# Altium integrated library Integrated_Library.IntLib: 173 symbols (part 1 of 2) (continued)
## R1SE-0505/H2-R
designator U?
footprint R1SE-0505-SO8 (SO, 8-Leads, Body 12.75x10.70mm, Pitch 2.54mm, IPC Medium Density)
pins: 1 -VIN, 2 +VIN, 4 -VOUT, 5 +VUOT, 8 NC

## RCV_PADD
designator RCV?, comment RCV_PAD
pins: 1 A0, 2 A1, 3 A2, 4 A3, 5 A4, 6 A5, 7 A6, 8 A7, 9 B0, 10 B1, 11 B2, 12 B3, 13 B4, 14 B5, 15 B6, 16 B7

## RCVPad
designator *
pins: 1 A0, 2 A1, 3 A2, 4 A3, 5 A4, 6 A5, 7 A6, 8 A7, 9 GND

## rectifier
designator *

## RESISTOR VAR_0
designator R?
OriginalSymbolOrigin: (0,0)
pins: 1 A, 2 WIPER, 3 B

## SMW250-02
designator J?
OriginalSymbolOrigin: (0,0)
footprint SMW250-02P
pins: 1, 2

## SN65HVD230_1
designator U?
pins: 1 D, 2 GND, 3 VCC (power), 4 R, 5 VREF, 6 CANL, 7 CANH, 8 RS (power)

## SN65HVD1040
designator *
pins: 1 TXD, 2 GND, 3 VCC (power), 4 RXD, 5 SPLIT, 6 CANL, 7 CANH, 8 STB (power)

## STWD100
designator U?
pins: 1 ~{WDO}, 2 GND, 3 ~{EN}, 4 WDI, 5 VCC

## TC1014
designator U?
Manufacturer: MICROCHIP; Part Number: TC1014-3.3VCT713
footprint SOT95P245X110-5N (SOT23, 5-Leads, Body 2.90x2.45mm, Pitch 0.95mm, IPC Medium Density)
pins: 1 +VIN, 2 GND, 3 /SHDN, 4 Bypass, 5 +VOUT

## test
designator *
pins: 6

## TestPoint
designator TP?
pins: 1 TP

## THS4211
designator U?
pins: 1 NC, 2 IN-, 3 IN+, 4 VS-, 5 NC, 6 Vout, 7 Vs+, 8 NC

## TL431
designator D?
Shunt regulator
footprint SOT95P245X110-3N (SOT23, 3-Leads, Body 2.90x2.45mm, Pitch 0.95mm, IPC Medium Density)
pins: 1 Cathode, 2 Ref, 3 Anode

## TLP181
designator U?
OriginalSymbolOrigin: (0,0)
pins: 1 ANODE, 3 CATHODE, 4 EMITTER, 6 COLLECTOR

## TLP241
designator U?
pins: 1 ANODE, 2 CATHODE, 3 Drain, 4 Drain

## TPS73512
designator U?, comment TPS53312
pins: 1 OUT, 2 NC, 3 NR/FB, 4 GND, 5 EN, 6 NC, 7 NC, 8 IN, 9 Thermal PAD

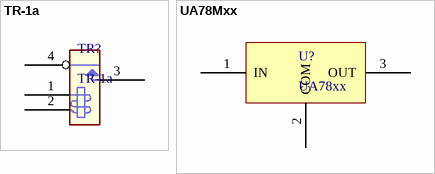
[diagram p5: symbols TR-1a to UA78Mxx]

## TR-1a
designator TR?
footprint TR1A
pins: 1 COIL1, 2 COIL2, 3 NO, 4 COMMON

## UA78Mxx
designator U?, comment UA78xx
footprint SOT230P700X180-4N (SOT223, 4-Leads, Body 6.50x7.00mm (avg), Pitch 2.30mm, IPC Medium Density)
pins: 1 IN, 2 COM, 3 OUT


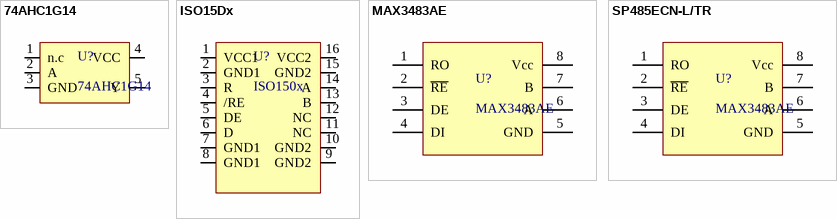
[diagram p6: symbols 74AHC1G14 to SP485ECN-L/TR]

## 74AHC1G14
designator U?
Manufacturer: nexperia; Part Number: 74AHC1G14
footprint SOT95P245X110-5N (SOT23, 5-Leads, Body 2.90x2.45mm, Pitch 0.95mm, IPC Medium Density)
pins: 1 n.c, 2 A, 3 GND, 4 VCC, 5 Y

## ISO15Dx
designator U?, comment ISO150x
ISOx5 Isolated 3.3-V Half- and Full-Duplex RS-485 Transceivers; Part Number: 74AHC1G14; Manufacturer: nexperia
footprint SOIC127P1030X265-16N (SOIC, 16-Leads, Body 10.30x7.50mm, Pitch 1.27mm, IPC Medium Density)
pins: 1 VCC1, 2 GND1, 3 R, 4 /RE, 5 DE, 6 D, 7 GND1, 8 GND1, 9 GND2, 10 GND2, 11 NC, 12 NC, 13 B, 14 A, 15 GND2, 16 VCC2

## MAX3483AE
designator U?
pins: 1 RO, 2 ~{RE}, 3 DE, 4 DI, 5 GND, 6 A, 7 B, 8 Vcc

## SP485ECN-L/TR
designator U?, comment MAX3483AE
Part Number: SP481ECN-L/TR; Manufacturer: MaxLinear
footprint SOIC127P600X175-8N (SOIC, 8-Leads, Body 4.90x3.90mm, Pitch 1.27mm, IPC Medium Density)
pins: 1 RO, 2 ~{RE}, 3 DE, 4 DI, 5 GND, 6 A, 7 B, 8 Vcc


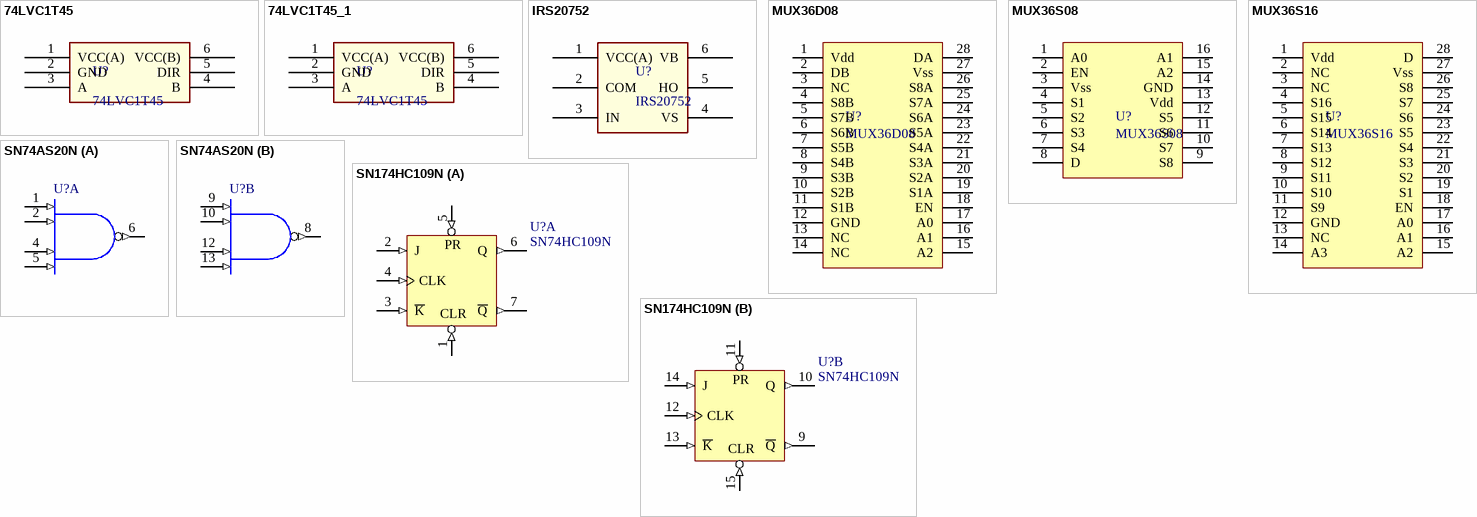
[diagram p7: symbols 74LVC1T45 to SN174HC109N]

## 74LVC1T45
designator U?
pins: 1 VCC(A), 2 GND, 3 A, 4 B, 5 DIR, 6 VCC(B)

## 74LVC1T45_1
designator U?, comment 74LVC1T45
footprint SOT95P285X130-6N (SOT23, 6-Leads, Body 3.00x2.85mm, Pitch 0.95mm, IPC Medium Density)
pins: 1 VCC(A), 2 GND, 3 A (power), 4 B, 5 DIR, 6 VCC(B)

## IRS20752
designator U?
Manufacturer: Infineon; ModelNumber: *
footprint SOT95P280X145-6N (SOT23, 6-Leads, Body 2.90x2.80mm, Pitch 0.95mm, IPC Medium Density)
pins: 1 VCC(A), 2 COM, 3 IN, 4 VS, 5 HO, 6 VB

## MUX36D08
designator U?
pins: 1 Vdd, 2 DB, 3 NC, 4 S8B, 5 S7B, 6 S6B, 7 S5B, 8 S4B, 9 S3B, 10 S2B, 11 S1B, 12 GND, 13 NC, 14 NC, 15 A2, 16 A1, 17 A0, 18 EN, 19 S1A, 20 S2A, 21 S3A, 22 S4A, 23 S5A, 24 S6A, 25 S7A, 26 S8A, 27 Vss, 28 DA

## MUX36S08
designator U?
pins: 1 A0, 2 EN, 3 Vss, 4 S1, 5 S2, 6 S3, 7 S4, 8 D, 9 S8, 10 S7, 11 S6, 12 S5, 13 Vdd, 14 GND, 15 A2, 16 A1

## MUX36S16
designator U?
pins: 1 Vdd, 2 NC, 3 NC, 4 S16, 5 S15, 6 S14, 7 S13, 8 S12, 9 S11, 10 S10, 11 S9, 12 GND, 13 NC, 14 A3, 15 A2, 16 A1, 17 A0, 18 EN, 19 S1, 20 S2, 21 S3, 22 S4, 23 S5, 24 S6, 25 S7, 26 S8, 27 Vss, 28 D

## SN74AS20N
designator U?
Dual 4-Input Positive-NAND Gate; Note: Pins 3 and 11 are not connected and not drawn; Published: 8-Jun-2000; LatestRevisionDate: 04-Mar-2005; LatestRevisionNote: Stylized 3D Model Added.; DatasheetVersion: Dec-1994; PackageVersion: Oct-1995; PackageReference: N014; Publisher: Altium Limited; PackageDescription: DIP; 14 Leads; Row Spacing 7.62 mm; Pitch 2.54 mm; ComponentLink1Description: Manufacturer Link; ComponentLink1URL: http://www.ti.com/; ComponentLink2Description: Datasheet; ComponentLink2URL: http://www-s.ti.com/sc/ds/sn74als20a.pdf
footprint N014 (DIP; 14 Leads; Row Spacing 7.62 mm; Pitch 2.54 mm)
3D model N014 (DIP; 14 Leads; Row Spacing 7.62 mm; Pitch 2.54 mm)
signal-integrity model SN74AS20N
pins on every part: 7 GND (power) hidden to GND, 14 VCC (power) hidden to VCC
part A pins: 1 A (in), 2 B (in), 4 C (in), 5 D (in), 6 Y (out)
part B pins: 8 Y (out), 9 A (in), 10 B (in), 12 C (in), 13 D (in)

## SN174HC109N
designator U?, comment SN74HC109N
Dual J-K Positive-Edge-Triggered Flip-Flop with Clear and Preset; Published: 8-Jun-2000; LatestRevisionDate: 04-Mar-2005; LatestRevisionNote: Stylized 3D Model Added.; DatasheetVersion: Jun-1989; PackageVersion: Oct-1995; PackageReference: N016; Publisher: Altium Limited; PackageDescription: DIP; 16 Leads; Row Spacing 7.62 mm; Pitch 2.54 mm; Code_JEDEC: MS-001-BB; ComponentLink1Description: Manufacturer Link; ComponentLink1URL: http://www.ti.com/; ComponentLink2Description: Datasheet; ComponentLink2URL: http://www-s.ti.com/sc/ds/sn74hc109.pdf
footprint N016 (DIP; 16 Leads; Row Spacing 7.62 mm; Pitch 2.54 mm)
3D model N016 (DIP; 16 Leads; Row Spacing 7.62 mm; Pitch 2.54 mm)
signal-integrity model SN74HC109N
pins on every part: 8 GND (power) hidden to GND, 16 VCC (power) hidden to VCC
part A pins: 1 CLR (in), 2 J (in), 3 ~{K} (in), 4 CLK (in), 5 PR (in), 6 Q (out), 7 ~{Q} (out)
part B pins: 9 ~{Q} (out), 10 Q (out), 11 PR (in), 12 CLK (in), 13 ~{K} (in), 14 J (in), 15 CLR (in)


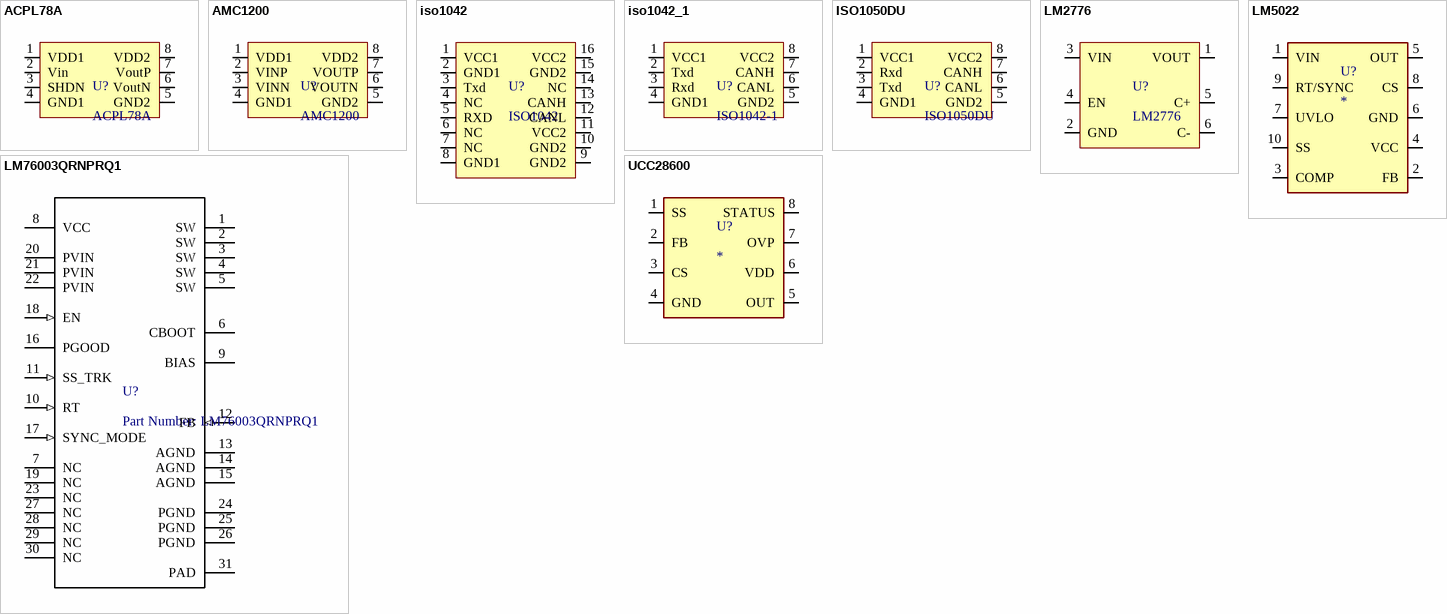
[diagram p8: symbols ACPL78A to UCC28600]

## ACPL78A
designator U?
footprint SOIC127P1150X318-8N-ACPL87A (SOIC, 8-Leads, Body 5.85x6.85mm, Pitch 1.27mm, IPC Medium Density)
pins: 1 VDD1, 2 Vin, 3 SHDN, 4 GND1, 5 GND2, 6 VoutN, 7 VoutP, 8 VDD2

## AMC1200
designator U?
footprint SOIC127P1110X280-8N-AMC (SOIC, 8-Leads, Body 5.85x7.50mm, Pitch 1.27mm, IPC Medium Density)
pins: 1 VDD1, 2 VINP, 3 VINN, 4 GND1, 5 GND2, 6 VOUTN, 7 VOUTP, 8 VDD2

## iso1042
designator U?, comment ISO1042
pins: 1 VCC1, 2 GND1, 3 Txd, 4 NC, 5 RXD, 6 NC, 7 NC, 8 GND1, 9 GND2, 10 GND2, 11 VCC2, 12 CANL, 13 CANH, 14 NC, 15 GND2, 16 VCC2

## iso1042_1
designator U?, comment ISO1042-1
footprint PG-DSO-8 (SOP, 8-Leads, Body 5,0x4,0mm (max), Pitch 1,27mm, IPC Medium Density)
pins: 1 VCC1, 2 Txd, 3 Rxd, 4 GND1, 5 GND2, 6 CANL, 7 CANH, 8 VCC2

## ISO1050DU
designator U?
ISO1050 Isolated CAN Transceiver
footprint PG-DSO-8 (SOP, 8-Leads, Body 5,0x4,0mm (max), Pitch 1,27mm, IPC Medium Density)
pins: 1 VCC1, 2 Rxd, 3 Txd, 4 GND1, 5 GND2, 6 CANL, 7 CANH, 8 VCC2

## LM2776
designator U?
Manufacturer: Texas Instruments; Part Number: LM2776
footprint SOT95P280X145-6N (SOT23, 6-Leads, Body 2.90x2.80mm, Pitch 0.95mm, IPC Medium Density)
pins: 1 VOUT, 2 GND, 3 VIN, 4 EN, 5 C+, 6 C-

## LM5022
designator U?
footprint TSSOP50P490X110-10N (TSSOP, 10-Leads, Body 3.00x3.00mm, Pitch 0.50mm, IPC Medium Density)
pins: 1 VIN, 2 FB, 3 COMP, 4 VCC, 5 OUT, 6 GND, 7 UVLO, 8 CS, 9 RT/SYNC, 10 SS

## LM76003QRNPRQ1
designator U?, comment Part Number: LM76003QRNPRQ1
No Description Available; Vendor: Texas Instruments; Built_By: Texas_Instrument_Team; Manufacturer_Part_Number: LM76003QRNPRQ1; Copyright: Copyright (C) 2018 Accelerated Designs. All rights reserved; RefDes: RefDes; Type: DEV; Value: Value
pins: 1 SW (power), 2 SW (power), 3 SW (power), 4 SW (power), 5 SW (power), 6 CBOOT (power), 7 NC, 8 VCC (power), 9 BIAS, 10 RT (in), 11 SS_TRK (in), 12 FB (in), 13 AGND (power), 14 AGND (power), 15 AGND (power), 16 PGOOD (oc), 17 SYNC_MODE (in), 18 EN (in), 19 NC, 20 PVIN (power), 21 PVIN (power), 22 PVIN (power), 23 NC, 24 PGND (power), 25 PGND (power), 26 PGND (power), 27 NC, 28 NC, 29 NC, 30 NC, 31 PAD (power)

## UCC28600
designator U?
footprint SOIC127P600X175-8N (SOIC, 8-Leads, Body 4.90x3.90mm, Pitch 1.27mm, IPC Medium Density)
pins: 1 SS, 2 FB, 3 CS, 4 GND, 5 OUT, 6 VDD, 7 OVP, 8 STATUS


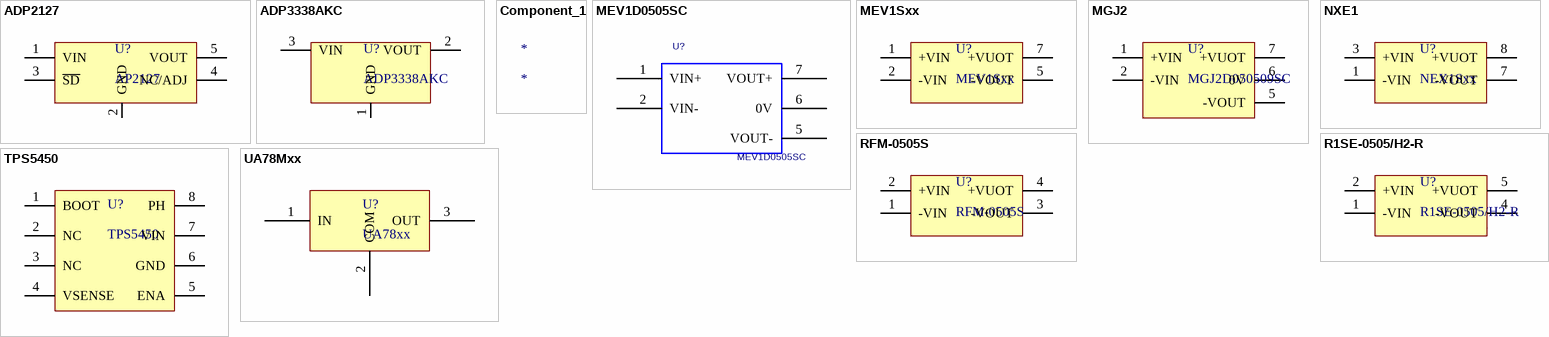
[diagram p9: symbols ADP2127 to UA78Mxx]

## ADP2127
designator U?, comment AP2127
footprint SOT95P245X110-5N (SOT23, 5-Leads, Body 2.90x2.45mm, Pitch 0.95mm, IPC Medium Density)
pins: 1 VIN, 2 GND, 3 ~{SD}, 4 NC/ADJ, 5 VOUT

## ADP3338AKC
designator U?
Manufacturer: Analog Devices; ModelNumber: *
footprint SOT230P700X180-4N (SOT223, 4-Leads, Body 6.50x7.00mm (avg), Pitch 2.30mm, IPC Medium Density)
pins: 1 GND, 2 VOUT, 3 VIN

## Component_1
designator *

## MEV1D0505SC
designator U?
Manufacturer: Murata; ModelNumber: MEV1D0505SC
footprint MEV1D (Dual output)
pins: 1 VIN+, 2 VIN-, 5 VOUT-, 6 0V, 7 VOUT+

## MEV1Sxx
designator U?
3kVDC Isolated 1W Single & Dual Output DC-DC Converters; Manufacturer: Murata; ModelNumber: MEV1S
footprint MEV1S
pins: 1 +VIN, 2 -VIN, 5 -VOUT, 7 +VUOT

## MGJ2
designator U?, comment MGJ2D050509SC
footprint MGJ2Dxx
pins: 1 +VIN, 2 -VIN, 5 -VOUT, 6 0V, 7 +VUOT

## NXE1
designator U?, comment NEX1Sxx
3kVDC Isolated 1W Single & Output DC-DC Converters; Manufacturer: Murata; Part Number: MEV1S
footprint NEX1 (Murata Power-Isolated 1W Single Output SM DC-DC Converters)
pins: 1 -VIN, 3 +VIN, 7 -VOUT, 8 +VUOT

## R1SE-0505/H2-R
designator U?
footprint R1SE-0505-SO8 (SO, 8-Leads, Body 12.75x10.70mm, Pitch 2.54mm, IPC Medium Density)
pins: 1 -VIN, 2 +VIN, 4 -VOUT, 5 +VUOT, 8 NC

## RFM-0505S
designator U?
footprint RFM-0505S
pins: 1 -VIN, 2 +VIN, 3 -VOUT, 4 +VUOT

## TPS5450
designator U?
footprint SOIC127P600X175-8N - TPAD (SOIC, 8-Leads, Body 4.90x3.90mm, Pitch 1.27mm, IPC Medium Density)
pins: 1 BOOT, 2 NC, 3 NC, 4 VSENSE, 5 ENA, 6 GND, 7 VIN, 8 PH

## UA78Mxx
designator U?, comment UA78xx
footprint SOT230P700X180-4N (SOT223, 4-Leads, Body 6.50x7.00mm (avg), Pitch 2.30mm, IPC Medium Density)
pins: 1 IN, 2 COM, 3 OUT


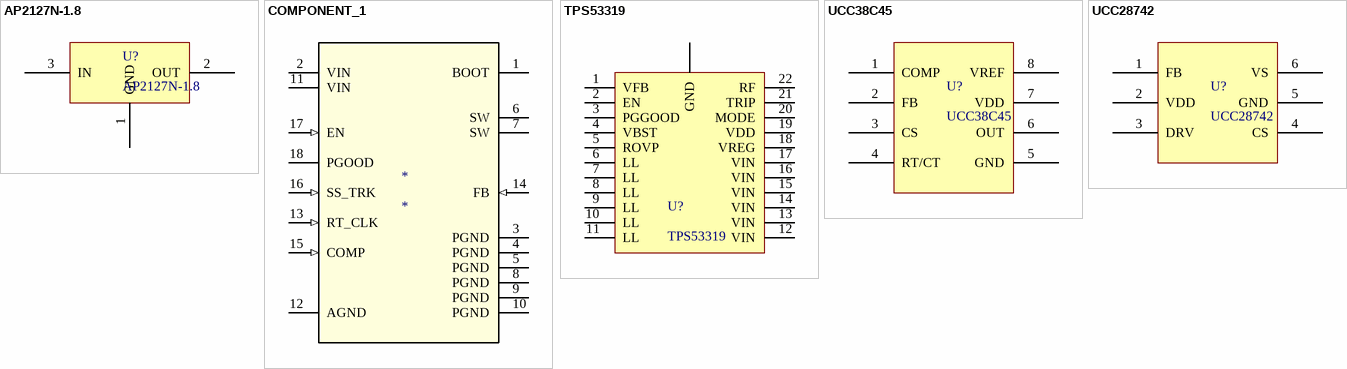
[diagram p10: symbols AP2127N-1.8 to UCC28742]

## AP2127N-1.8
designator U?
footprint SOT95P245X110-3N (SOT23, 3-Leads, Body 2.90x2.45mm, Pitch 0.95mm, IPC Medium Density)
pins: 1 GND, 2 OUT, 3 IN

## COMPONENT_1
designator *
pins: 1 BOOT, 2 VIN (power), 3 PGND (power), 4 PGND (power), 5 PGND (power), 6 SW (power), 7 SW (power), 8 PGND (power), 9 PGND (power), 10 PGND (power), 11 VIN (power), 12 AGND (power), 13 RT_CLK (in), 14 FB (in), 15 COMP (in), 16 SS_TRK (in), 17 EN (in), 18 PGOOD (oc)

## TPS53319
designator U?
footprint DFN_22_6X5_0.5
pins: 1 VFB, 2 EN, 3 PGGOOD, 4 VBST, 5 ROVP, 6 LL, 7 LL, 8 LL, 9 LL, 10 LL, 11 LL, 12 VIN, 13 VIN, 14 VIN, 15 VIN, 16 VIN, 17 VIN, 18 VREG, 19 VDD, 20 MODE, 21 TRIP, 22 RF, GND

## UCC38C45
designator U?
footprint SOIC127P600X175-8N (SOIC, 8-Leads, Body 4.90x3.90mm, Pitch 1.27mm, IPC Medium Density)
pins: 1 COMP, 2 FB, 3 CS, 4 RT/CT, 5 GND, 6 OUT, 7 VDD, 8 VREF

## UCC28742
designator U?
Flayback Controller / SOT23-6; Manufacturer: TI; Part Number: UCC28742
footprint SOT95P280X145-6N (SOT23, 6-Leads, Body 2.90x2.80mm, Pitch 0.95mm, IPC Medium Density)
pins: 1 FB, 2 VDD, 3 DRV, 4 CS, 5 GND, 6 VS


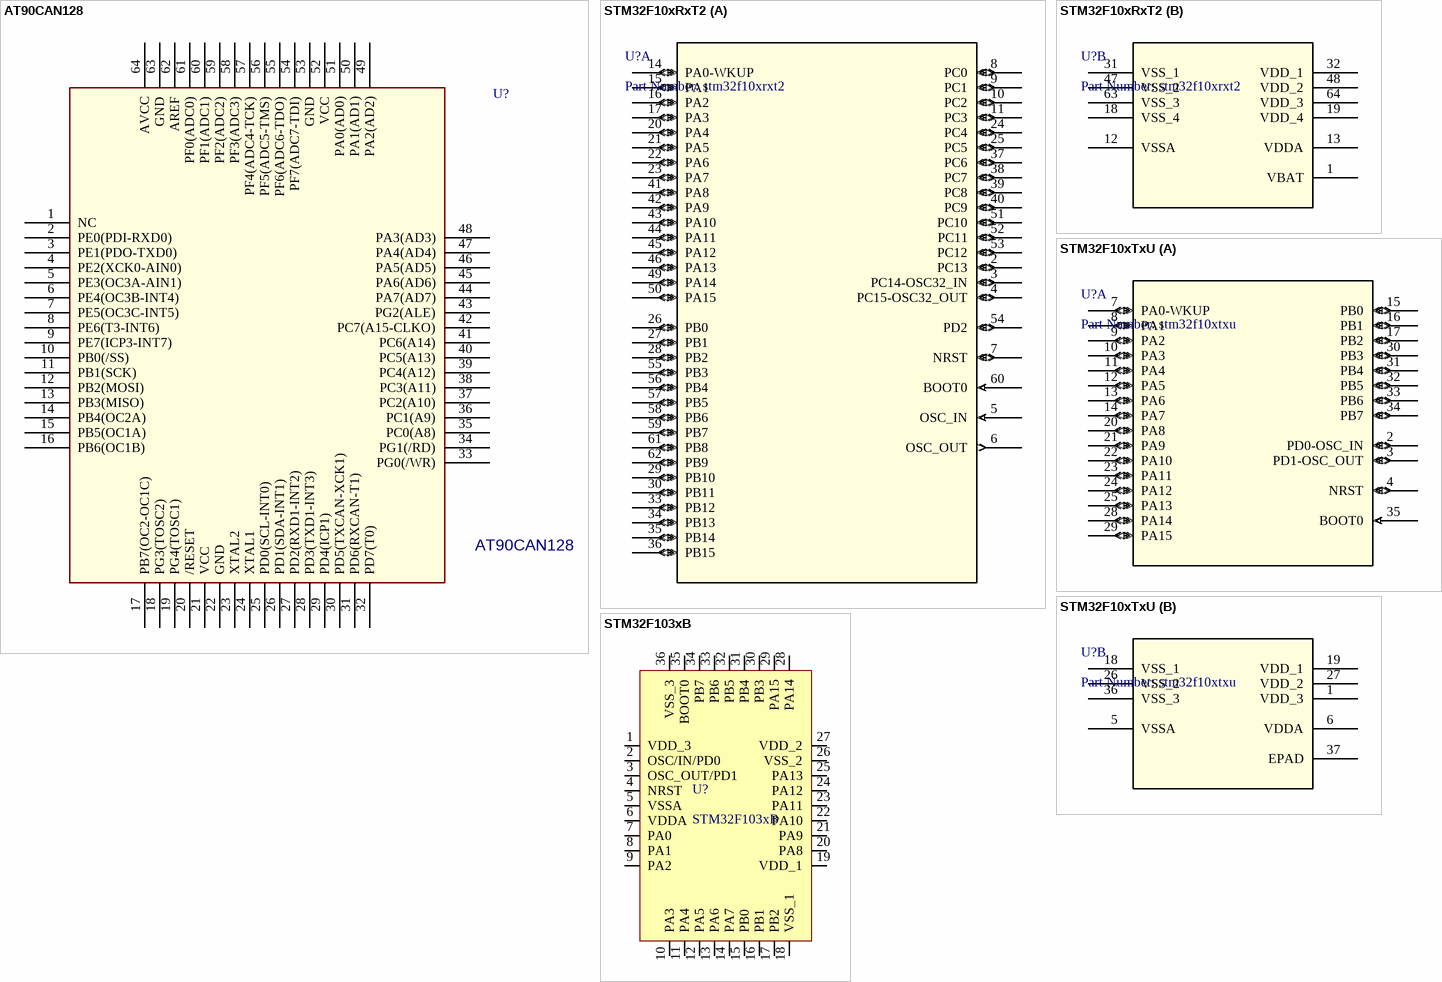
[diagram p11: symbols AT90CAN128 to STM32F103xB]

## AT90CAN128
designator U?
footprint 64A_L (64-Pin Thin Quad Flat Pack 0.8 mm Pitch, IPC High Density)
pins: 1 NC, 2 PE0(PDI-RXD0), 3 PE1(PDO-TXD0), 4 PE2(XCK0-AIN0), 5 PE3(OC3A-AIN1), 6 PE4(OC3B-INT4), 7 PE5(OC3C-INT5), 8 PE6(T3-INT6), 9 PE7(ICP3-INT7), 10 PB0(/SS), 11 PB1(SCK), 12 PB2(MOSI), 13 PB3(MISO), 14 PB4(OC2A), 15 PB5(OC1A), 16 PB6(OC1B), 17 PB7(OC2-OC1C), 18 PG3(TOSC2), 19 PG4(TOSC1), 20 /RESET, 21 VCC, 22 GND, 23 XTAL2, 24 XTAL1, 25 PD0(SCL-INT0), 26 PD1(SDA-INT1), 27 PD2(RXD1-INT2), 28 PD3(TXD1-INT3), 29 PD4(ICP1), 30 PD5(TXCAN-XCK1), 31 PD6(RXCAN-T1), 32 PD7(T0), 33 PG0(/WR), 34 PG1(/RD), 35 PC0(A8), 36 PC1(A9), 37 PC2(A10), 38 PC3(A11), 39 PC4(A12), 40 PC5(A13), 41 PC6(A14), 42 PC7(A15-CLKO), 43 PG2(ALE), 44 PA7(AD7), 45 PA6(AD6), 46 PA5(AD5), 47 PA4(AD4), 48 PA3(AD3), 49 PA2(AD2), 50 PA1(AD1), 51 PA0(AD0), 52 VCC, 53 GND, 54 PF7(ADC7-TDI), 55 PF6(ADC6-TDO), 56 PF5(ADC5-TMS), 57 PF4(ADC4-TCK), 58 PF3(ADC3), 59 PF2(ADC2), 60 PF1(ADC1), 61 PF0(ADC0), 62 AREF, 63 GND, 64 AVCC

## STM32F10xRxT2
designator U?, comment Part Number: stm32f10xrxt2
No Description Available; Vendor: STMicroelectronics; Manufacturer_Part_Number: stm32f10xrxt2; Copyright: Copyright (C) 2016 Accelerated Designs. All rights reserved; RefDes: RefDes; Type: DEV; Value: Value
footprint LQFP64-10x10mm (Pitch 0.50mm)
part A pins: 2 PC13 (io), 3 PC14-OSC32_IN (io), 4 PC15-OSC32_OUT (io), 5 OSC_IN (in), 6 OSC_OUT (out), 7 NRST (io), 8 PC0 (io), 9 PC1 (io), 10 PC2 (io), 11 PC3 (io), 14 PA0-WKUP (io), 15 PA1 (io), 16 PA2 (io), 17 PA3 (io), 20 PA4 (io), 21 PA5 (io), 22 PA6 (io), 23 PA7 (io), 24 PC4 (io), 25 PC5 (io), 26 PB0 (io), 27 PB1 (io), 28 PB2 (io), 29 PB10 (io), 30 PB11 (io), 33 PB12 (io), 34 PB13 (io), 35 PB14 (io), 36 PB15 (io), 37 PC6 (io), 38 PC7 (io), 39 PC8 (io), 40 PC9 (io), 41 PA8 (io), 42 PA9 (io), 43 PA10 (io), 44 PA11 (io), 45 PA12 (io), 46 PA13 (io), 49 PA14 (io), 50 PA15 (io), 51 PC10 (io), 52 PC11 (io), 53 PC12 (io), 54 PD2 (io), 55 PB3 (io), 56 PB4 (io), 57 PB5 (io), 58 PB6 (io), 59 PB7 (io), 60 BOOT0 (in), 61 PB8 (io), 62 PB9 (io)
part B pins: 1 VBAT (power), 12 VSSA (power), 13 VDDA (power), 18 VSS_4 (power), 19 VDD_4 (power), 31 VSS_1 (power), 32 VDD_1 (power), 47 VSS_2 (power), 48 VDD_2 (power), 63 VSS_3 (power), 64 VDD_3 (power)

## STM32F10xTxU
designator U?, comment Part Number: stm32f10xtxu
No Description Available; Vendor: STMicroelectronics; Manufacturer_Part_Number: stm32f10xtxu; Copyright: Copyright (C) 2016 Accelerated Designs. All rights reserved; RefDes: RefDes; Type: DEV; Value: Value
footprint QFN50P600X600X100_HS-37N - REV2 (QFN, 36-Leads, Body 6.00x6.00mm, Pitch 0.50mm, Thermal Pad 2.05x2.05mm, IPC Medium Density)
part A pins: 2 PD0-OSC_IN (io), 3 PD1-OSC_OUT (io), 4 NRST (io), 7 PA0-WKUP (io), 8 PA1 (io), 9 PA2 (io), 10 PA3 (io), 11 PA4 (io), 12 PA5 (io), 13 PA6 (io), 14 PA7 (io), 15 PB0 (io), 16 PB1 (io), 17 PB2 (io), 20 PA8 (io), 21 PA9 (io), 22 PA10 (io), 23 PA11 (io), 24 PA12 (io), 25 PA13 (io), 28 PA14 (io), 29 PA15 (io), 30 PB3 (io), 31 PB4 (io), 32 PB5 (io), 33 PB6 (io), 34 PB7 (io), 35 BOOT0 (in)
part B pins: 1 VDD_3 (power), 5 VSSA (power), 6 VDDA (power), 18 VSS_1 (power), 19 VDD_1 (power), 26 VSS_2 (power), 27 VDD_2 (power), 36 VSS_3 (power), 37 EPAD

## STM32F103xB
designator U?
footprint QFN50P600X600X100_HS-37N - REV1 (QFN, 36-Leads, Body 6.00x6.00mm, Pitch 0.50mm, Thermal Pad 2.05x2.05mm, IPC Medium Density)
pins: 1 VDD_3, 2 OSC/IN/PD0, 3 OSC_OUT/PD1, 4 NRST, 5 VSSA, 6 VDDA, 7 PA0, 8 PA1, 9 PA2, 10 PA3, 11 PA4, 12 PA5, 13 PA6, 14 PA7, 15 PB0, 16 PB1, 17 PB2, 18 VSS_1, 19 VDD_1, 20 PA8, 21 PA9, 22 PA10, 23 PA11, 24 PA12, 25 PA13, 26 VSS_2, 27 VDD_2, 28 PA14, 29 PA15, 30 PB3, 31 PB4, 32 PB5, 33 PB6, 34 PB7, 35 BOOT0, 36 VSS_3, 37 PAD hidden to GND

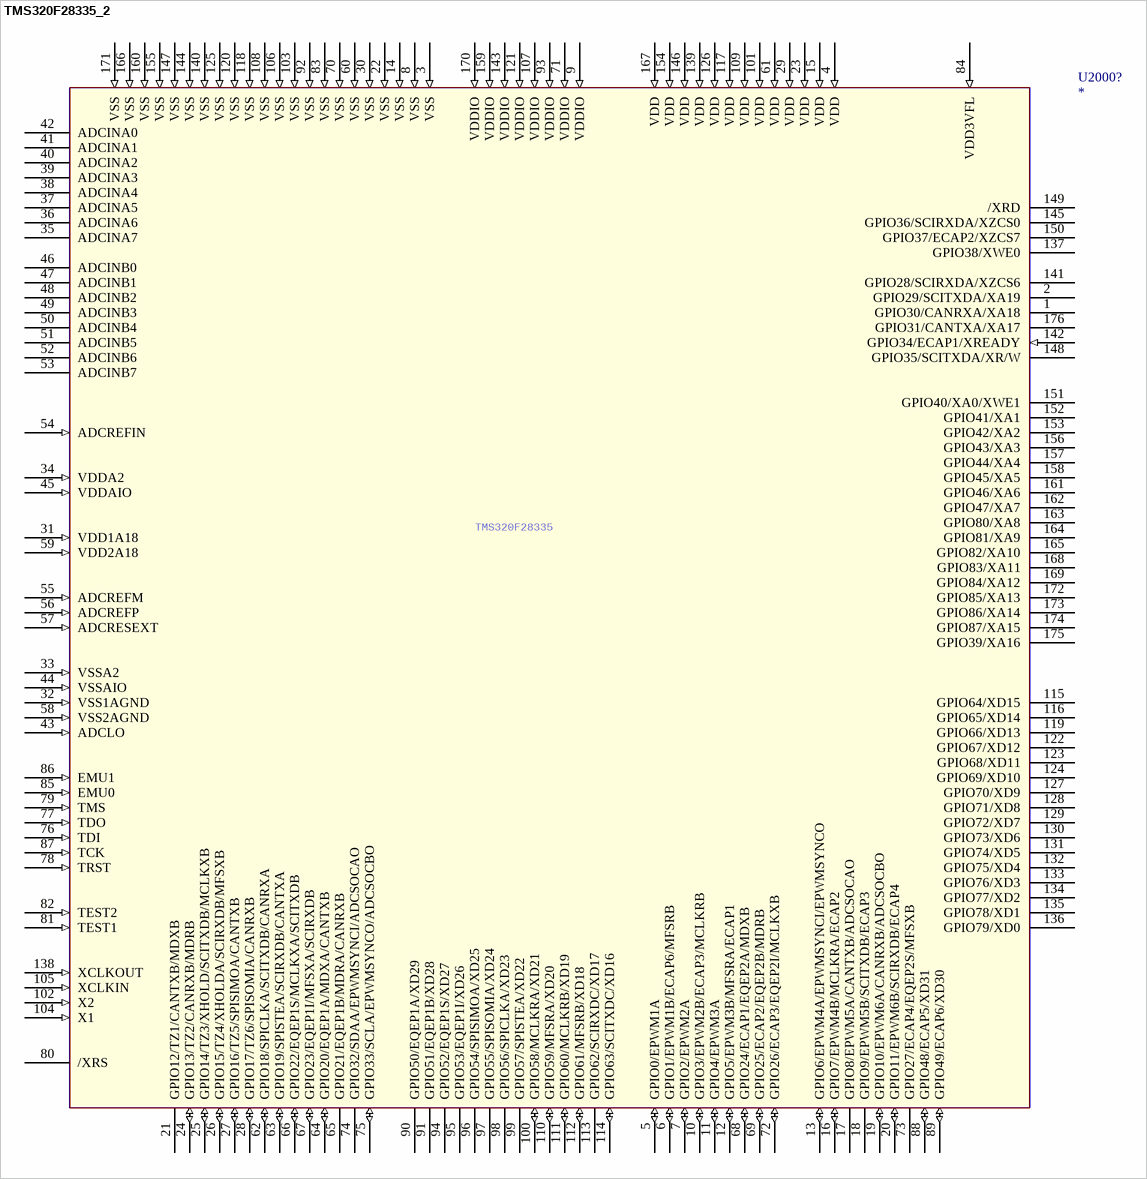
[diagram p12: symbol TMS320F28335_2]

## TMS320F28335_2
designator U2000?
OriginalSymbolOrigin: (0,0)
pins: 1 GPIO30/CANRXA/XA18, 2 GPIO29/SCITXDA/XA19, 3 VSS (in), 4 VDD (in), 5 GPIO0/EPWM1A (io), 6 GPIO1/EPWM1B/ECAP6/MFSRB (io), 7 GPIO2/EPWM2A (io), 8 VSS (in), 9 VDDIO (in), 10 GPIO3/EPWM2B/ECAP3/MCLKRB (io), 11 GPIO4/EPWM3A (io), 12 GPIO5/EPWM3B/MFSRA/ECAP1 (io), 13 GPIO6/EPWM4A/EPWMSYNCI/EPWMSYNCO (io), 14 VSS (in), 15 VDD (in), 16 GPIO7/EPWM4B/MCLKRA/ECAP2 (io), 17 GPIO8/EPWM5A/CANTXB/ADCSOCAO, 18 GPIO9/EPWM5B/SCITXDB/ECAP3, 19 GPIO10/EPWM6A/CANRXB/ADCSOCBO (io), 20 GPIO11/EPWM6B/SCIRXDB/ECAP4 (io), 21 GPIO12/TZ1/CANTXB/MDXB, 22 VSS (in), 23 VDD (in), 24 GPIO13/TZ2/CANRXB/MDRB (io), 25 GPIO14/TZ3/XHOLD/SCITXDB/MCLKXB (io), 26 GPIO15/TZ4/XHOLDA/SCIRXDB/MFSXB (io), 27 GPIO16/TZ5/SPISIMOA/CANTXB (io), 28 GPIO17/TZ6/SPISOMIA/CANRXB (io), 29 VDD (in), 30 VSS (in), 31 VDD1A18 (in), 32 VSS1AGND (in), 33 VSSA2 (in), 34 VDDA2 (in), 35 ADCINA7, 36 ADCINA6, 37 ADCINA5, 38 ADCINA4, 39 ADCINA3, 40 ADCINA2, 41 ADCINA1, 42 ADCINA0, 43 ADCLO (in), 44 VSSAIO (in), 45 VDDAIO (in), 46 ADCINB0, 47 ADCINB1, 48 ADCINB2, 49 ADCINB3, 50 ADCINB4, 51 ADCINB5, 52 ADCINB6, 53 ADCINB7, 54 ADCREFIN (in), 55 ADCREFM (in), 56 ADCREFP (in), 57 ADCRESEXT (in), 58 VSS2AGND (in), 59 VDD2A18 (in), 60 VSS (in), 61 VDD (in), 62 GPIO18/SPICLKA/SCITXDB/CANRXA (io), 63 GPIO19/SPISTEA/SCIRXDB/CANTXA (io), 64 GPIO20/EQEP1A/MDXA/CANTXB (io), 65 GPIO21/EQEP1B/MDRA/CANRXB, 66 GPIO22/EQEP1S/MCLKXA/SCITXDB (io), 67 GPIO23/EQEP1I/MFSXA/SCIRXDB (io), 68 GPIO24/ECAP1/EQEP2A/MDXB (io), 69 GPIO25/ECAP2/EQEP2B/MDRB (io), 70 VSS (in), 71 VDDIO (in), 72 GPIO26/ECAP3/EQEP2I/MCLKXB (io), 73 GPIO27/ECAP4/EQEP2S/MFSXB, 74 GPIO32/SDAA/EPWMSYNCI/ADCSOCAO, 75 GPIO33/SCLA/EPWMSYNCO/ADCSOCBO (io), 76 TDI (in), 77 TDO (in), 78 TRST (in), 79 TMS (in), 80 /XRS, 81 TEST1 (in), 82 TEST2 (in), 83 VSS (in), 84 VDD3VFL (in), 85 EMU0 (in), 86 EMU1 (in), 87 TCK (in), 88 GPIO48/ECAP5/XD31 (io), 89 GPIO49/ECAP6/XD30 (io), 90 GPIO50/EQEP1A/XD29, 91 GPIO51/EQEP1B/XD28, 92 VSS (in), 93 VDDIO (in), 94 GPIO52/EQEP1S/XD27, 95 GPIO53/EQEP1I/XD26, 96 GPIO54/SPISIMOA/XD25, 97 GPIO55/SPISOMIA/XD24, 98 GPIO56/SPICLKA/XD23, 99 GPIO57/SPISTEA/XD22, 100 GPIO58/MCLKRA/XD21 (io), 101 VDD (in), 102 X2 (in), 103 VSS (in), 104 X1 (in), 105 XCLKIN (in), 106 VSS (in), 107 VDDIO (in), 108 VSS (in), 109 VDD (in), 110 GPIO59/MFSRA/XD20 (io), 111 GPIO60/MCLKRB/XD19 (io), 112 GPIO61/MFSRB/XD18 (io), 113 GPIO62/SCIRXDC/XD17, 114 GPIO63/SCITXDC/XD16 (io), 115 GPIO64/XD15, 116 GPIO65/XD14, 117 VDD (in), 118 VSS (in), 119 GPIO66/XD13, 120 VSS (in), 121 VDDIO (in), 122 GPIO67/XD12, 123 GPIO68/XD11, 124 GPIO69/XD10, 125 VSS (in), 126 VDD (in), 127 GPIO70/XD9, 128 GPIO71/XD8, 129 GPIO72/XD7, 130 GPIO73/XD6, 131 GPIO74/XD5, 132 GPIO75/XD4, 133 GPIO76/XD3, 134 GPIO77/XD2, 135 GPIO78/XD1, 136 GPIO79/XD0, 137 GPIO38/XWE0, 138 XCLKOUT (in), 139 VDD (in), 140 VSS (in), 141 GPIO28/SCIRXDA/XZCS6, 142 GPIO34/ECAP1/XREADY (in), 143 VDDIO (in), 144 VSS (in), 145 GPIO36/SCIRXDA/XZCS0, 146 VDD (in), 147 VSS (in), 148 GPIO35/SCITXDA/XR/W, 149 /XRD, 150 GPIO37/ECAP2/XZCS7, 151 GPIO40/XA0/XWE1, 152 GPIO41/XA1, 153 GPIO42/XA2, 154 VDD (in), 155 VSS (in), 156 GPIO43/XA3, 157 GPIO44/XA4, 158 GPIO45/XA5, 159 VDDIO (in), 160 VSS (in), 161 GPIO46/XA6, 162 GPIO47/XA7, 163 GPIO80/XA8, 164 GPIO81/XA9, 165 GPIO82/XA10, 166 VSS (in), 167 VDD (in), 168 GPIO83/XA11, 169 GPIO84/XA12, 170 VDDIO (in), 171 VSS (in), 172 GPIO85/XA13, 173 GPIO86/XA14, 174 GPIO87/XA15, 175 GPIO39/XA16, 176 GPIO31/CANTXA/XA17
